# Altium footprint library GBA.PcbLib: 110 footprints (part 4 of 7)
Each footprint in its own frame and in the unit in brackets; x right, y up, seen from the top. Pads: shape width x height; smd on the part's side, far side on the other; paste and mask are expansions set on the pad; w line width, h text height; cw(c..) or ccw(c..) is an arc to the next point about the centre after c.
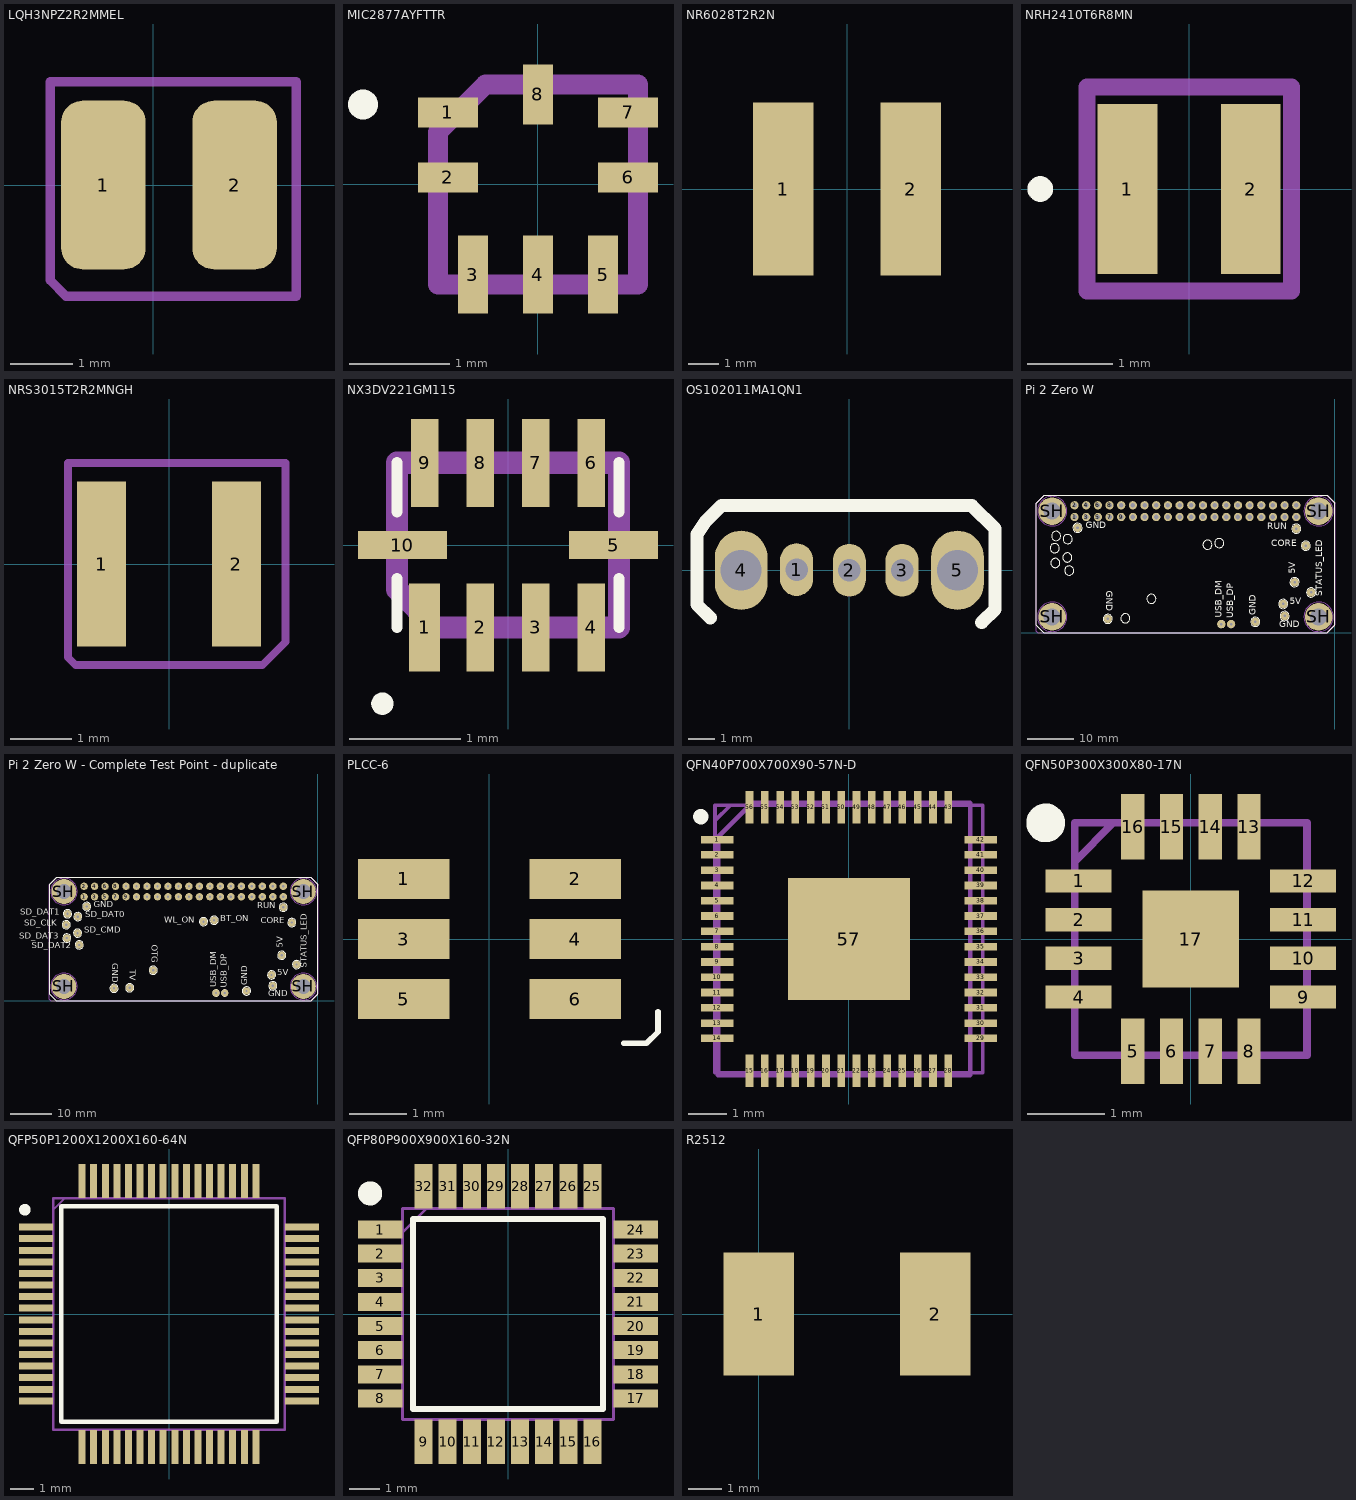
[diagram p3: the footprints below, top view; thin cyan lines are the x and y axes]

## LOGO [mm]

## LQH3NPZ2R2MMEL [mm]
pads (2):
  rrect50% 1.35x2.7 smd: 1(-0.8,0) 2(1.3,0)
Top Designator (Mech29):
  lines w0.15: -1.651,-1.524 -1.651,1.651 2.286,1.651 2.286,-1.778 -1.397,-1.778 -1.651,-1.524
  text ".Designator" at -0.8,-0.381 h0.8
3D body "Murata_LQH3NP_M0.step": height 1.4, standoff -0.01, extent -1.256,-1.5 1.764,1.5

## MIC2877AYFTTR [mm]
pads (8):
  rect 0.6x0.3 smd: 1(-0.9,0.72) 2(-0.9,0.07) 6(0.9,0.07) 7(0.9,0.72)
  rect 0.3x0.78 smd: 3(-0.65,-0.9) 4(0,-0.9) 5(0.65,-0.9)
  rect 0.3x0.6 smd: 8(0,0.9)
Top Overlay:
  lines w0.2: -1.8,0.8 ccw(c-1.75,0.8) -1.7,0.8 ; -1.8,0.8 cw(c-1.75,0.8) -1.7,0.8 ; -1.8,0.8 ccw(c-1.75,0.8) -1.7,0.8
Top Designator:
  lines w0.2: -1,-1 1,-1 1,1 -0.524,1 -1,0.524 -1,-1
  text ".Designator" at -0.889,-0.635 h1
3D body "MIC2877-AYFT-TR.stp": height 0.7, standoff 0, extent -1,-1 1,1

## NR6028T2R2N [mm]
pads (2):
  rect 2x5.7 smd: 1(-2.1,0) 2(2.1,0)
Top Designator (Mech29):
  text ".Designator" at -2.2,-0.8 h1
3D body "User Library-DJNR6028.STEP": height 2.58, standoff 0, extent -3,-3.073 3,3.073

## NRH2410T6R8MN [mm]
pads (2):
  rect 0.7x2 smd: 1(-0.725,0) 2(0.725,0)
Top Overlay:
  lines w0.2: -1.8,0 ccw(c-1.75,0) -1.7,0 ; -1.8,0 cw(c-1.75,0) -1.7,0 ; -1.8,0 ccw(c-1.75,0) -1.7,0
Top Designator:
  lines w0.2: -1.2,-1.2 1.2,-1.2 1.2,1.2 -1.2,1.2 -1.2,-1.2
  text ".Designator" at -1.016,-0.635 h1
3D body "NRH2410T6R8MN.stp": height 1.1, standoff 0, extent -1.2,-1.2 1.2,1.2

## NRS3015T2R2MNGH [mm]
pads (2):
  rect 0.8x2.7 smd: 1(-1.1,0) 2(1.1,0)
Top Designator (Mech29):
  lines w0.127: -1.651,-1.524 -1.651,1.651 1.905,1.651 1.905,-1.27 1.524,-1.651 -1.524,-1.651 -1.651,-1.524
  text ".Designator" at -1.016,-0.508 h1
3D body "User Library-nr3015.step": height 1.45, standoff -0.04, extent -1.524,-1.5 1.476,1.5

## NX3DV221GM115 [mm]
pads (10):
  rect 0.28x0.792 smd: 1(-0.75,-0.741)
  rect 0.25x0.792 smd: 2(-0.25,-0.741) 3(0.25,-0.741) 4(0.75,-0.741) 6(0.75,0.741) 7(0.25,0.741) 8(-0.25,0.741) 9(-0.75,0.741)
  rect 0.8x0.25 smd: 5(0.95,0) 10(-0.95,0)
Top Overlay:
  lines w0.1: -1,-0.741 -1,-0.3 ; -1,0.3 -1,0.741 ; 1,-0.741 1,-0.3 ; 1,0.3 1,0.741 ; -1.181,-1.427 cw(c-1.131,-1.427) -1.081,-1.427 cw(c-1.131,-1.427) -1.181,-1.427
Top Designator:
  lines w0.2: -1,-0.397 -1,0.741 1,0.741 1,-0.741 -0.656,-0.741 -1,-0.397
  text ".Designator" at -0.635,-0.381 h1
3D body "NX3DV221GM,115.stp": height 0.6, standoff 0, extent -1,-0.741 1,0.741

## OS102011MA1QN1 [mm]
pads (5):
  oval 1.25x2 hole 0.85: 1(-2,0.025) 2(0,0) 3(2,0)
  oval 2x3 hole 1.55: 4(-4.1,0) 5(4.1,0)
Top Overlay:
  lines w0.5: -5.275,-1.8 -5.775,-1.3 -5.775,1.362 -5.425,1.875 -4.85,2.45 4.65,2.45 5.525,1.575 5.525,-1.475 5.025,-1.975
Top Designator (Mech29):
  text ".Designator" at -3.875,-1.175 h1
3D body "OS102011MA1QN1.stp": height 4.4, standoff -3.2, extent -4.3,-6.2 4.3,2.2

## Pi 2 Zero W [mm]
pads (55):
  round 1.8 hole 1: 1(-56.63,25.23) 2(-56.63,27.77) 3(-54.09,25.23) 4(-54.09,27.77) 5(-51.55,25.23) 6(-51.55,27.77) 7(-49.01,25.23) 8(-49.01,27.77) 9(-46.47,25.23) 10(-46.47,27.77) 11(-43.93,25.23) 12(-43.93,27.77) 13(-41.39,25.23) 14(-41.39,27.77) 15(-38.85,25.23) 16(-38.85,27.77) 17(-36.31,25.23) 18(-36.31,27.77) 19(-33.77,25.23) 20(-33.77,27.77) 21(-31.23,25.23) 22(-31.23,27.77) 23(-28.69,25.23) 24(-28.69,27.77) 25(-26.15,25.23) 26(-26.15,27.77) 27(-23.61,25.23) 28(-23.61,27.77) 29(-21.07,25.23) 30(-21.07,27.77) 31(-18.53,25.23) 32(-18.53,27.77) 33(-15.99,25.23) 34(-15.99,27.77) 35(-13.45,25.23) 36(-13.45,27.77) 37(-10.91,25.23) 38(-10.91,27.77) 39(-8.37,25.23) 40(-8.37,27.77)
  round 1.8 hole 0.55: 5V_1(-11.21,6.3) 5V_2(-8.75,11.05) CORE(-6.3,18.98) DM(-24.68,1.92) DP(-22.55,1.92) GND_1(-55.99,22.87) GND_2(-49.38,3.05) GND_3(-17.29,2.41) GND_4(-10.9,3.69) RUN(-8.37,22.69) ST_LED(-5.15,8.8)
  round 6 / inner round 0 / far side round 0 hole 3.7 unplated: SH(-61.5,3.5) SH(-61.5,26.5) SH(-3.5,3.5) SH(-3.5,26.5)
Top Overlay:
  circle w0.254: c-56.63,27.77 r0.51
  circle w0.254: c-51.55,27.77 r0.51
  circle w0.254: c-54.09,27.77 r0.51
  circle w0.254: c-46.47,27.77 r0.51
  circle w0.254: c-36.31,27.77 r0.51
  circle w0.254: c-49.01,27.77 r0.51
  circle w0.254: c-43.93,27.77 r0.51
  circle w0.254: c-41.39,27.77 r0.51
  circle w0.254: c-38.85,27.77 r0.51
  circle w0.254: c-33.77,27.77 r0.51
  circle w0.254: c-13.45,27.77 r0.51
  circle w0.254: c-10.91,27.77 r0.51
  circle w0.254: c-21.07,27.77 r0.51
  circle w0.254: c-28.69,27.77 r0.51
  circle w0.254: c-26.15,27.77 r0.51
  circle w0.254: c-23.61,27.77 r0.51
  circle w0.254: c-18.53,27.77 r0.51
  circle w0.254: c-15.99,27.77 r0.51
  circle w0.254: c-31.23,27.77 r0.51
  circle w0.254: c-8.37,27.77 r0.51
  circle w0.254: c-56.63,25.23 r0.51
  circle w0.254: c-51.55,25.23 r0.51
  circle w0.254: c-54.09,25.23 r0.51
  circle w0.254: c-46.47,25.23 r0.51
  circle w0.254: c-36.31,25.23 r0.51
  circle w0.254: c-49.01,25.23 r0.51
  circle w0.254: c-43.93,25.23 r0.51
  circle w0.254: c-41.39,25.23 r0.51
  circle w0.254: c-38.85,25.23 r0.51
  circle w0.254: c-33.77,25.23 r0.51
  circle w0.254: c-13.45,25.23 r0.51
  circle w0.254: c-10.91,25.23 r0.51
  circle w0.254: c-8.37,25.23 r0.51
  circle w0.254: c-21.07,25.23 r0.51
  circle w0.254: c-28.69,25.23 r0.51
  circle w0.254: c-26.15,25.23 r0.51
  circle w0.254: c-23.61,25.23 r0.51
  circle w0.254: c-18.53,25.23 r0.51
  circle w0.254: c-15.99,25.23 r0.51
  circle w0.254: c-31.23,25.23 r0.51
  circle w0.254: c-61.5,3.5 r1.25
  circle w0.254: c-61.5,26.5 r1.25
  circle w0.254: c-39.9,7.42 r1
  circle w0.254: c-8.37,22.69 r1
  circle w0.254: c-22.55,1.92 r0.75
  circle w0.254: c-6.3,18.98 r1
  circle w0.254: c-49.38,3.05 r1
  circle w0.254: c-55.99,22.87 r1
  circle w0.254: c-10.9,3.69 r1
  circle w0.254: c-17.29,2.41 r1
  circle w0.254: c-27.7,19.2 r1
  circle w0.254: c-25.13,19.55 r1
  circle w0.254: c-8.75,11.05 r1
  circle w0.254: c-11.21,6.3 r1
  circle w0.254: c-5.15,8.8 r1
  circle w0.254: c-24.68,1.92 r0.75
  circle w0.254: c-45.58,3.17 r1
  circle w0.254: c-60.95,18.45 r1
  circle w0.254: c-58.2,16.42 r1
  circle w0.254: c-57.78,13.57 r1
  circle w0.254: c-60.65,21.1 r1
  circle w0.254: c-58.13,20.42 r1
  circle w0.254: c-60.8,15.22 r1
  circle w0.254: c-3.5,3.5 r1.25
  circle w0.254: c-3.5,26.5 r1.25
  lines w0.127: -65,1.627 -65,28.218 -63.218,30 -1.679,30 0,28.321 0,27.178 0,1.651 -1.651,0 -63.373,0 -65,1.627
  text "RUN" at -14.732,21.998 h2.5
  text "CORE" at -13.843,18.315 h2.5
  text "GND" at -54.229,22.252 h2.5
  text "GND" at -50.265,9.144 h2.5
  text "GND" at -16.663,3.81 h2.5
  text "GND" at -12.065,0.662 h2.5
  text "5V" at -9.779,5.742 h2.5
  text "5V" at -8.026,12.826 h2.5
  text "STATUS_LED" at -2.223,8.001 h2.5
  text "USB_DP" at -21.527,3.175 h2.5
  text "USB_DM" at -24.067,3.302 h2.5
Top Paste:
  drawing of 27 lines, arcs and shapes, not listed
Top Designator:
  lines w0.127: -65.024,0.381 -64.643,0 -1.778,0 0.127,1.905 0.127,28.067 -1.778,29.972 -63.246,29.972 -65.024,28.194 -65.024,0.381
  text ".Designator" at -42.545,13.843 h1.5
Mechanical 11:
  circle w0.1: c-61.5,3.5 r2.55
  circle w0.1: c-61.5,26.5 r2.55
  circle w0.1: c-3.5,26.5 r2.55
  circle w0.1: c-3.5,3.5 r2.55
Mechanical 13:
  circle w0.1: c-61.5,3.5 r2.55
  circle w0.1: c-61.5,26.5 r2.55
  circle w0.1: c-3.5,26.5 r2.55
  circle w0.1: c-3.5,3.5 r2.55
Mechanical 15:
  circle w0.05: c-61.5,3.5 r3.2
  circle w0.05: c-61.5,26.5 r3.2
  circle w0.05: c-3.5,26.5 r3.2
  circle w0.05: c-3.5,3.5 r3.2
  lines w0.05: -62,3.5 -61,3.5 ; -62,26.5 -61,26.5 ; -61.5,3 -61.5,4 ; -61.5,26 -61.5,27 ; -4,3.5 -3,3.5 ; -4,26.5 -3,26.5 ; -3.5,3 -3.5,4 ; -3.5,26 -3.5,27
3D body "9774025151.stp": height 2.5, standoff -1.4, extent -64.05,0.953 -58.95,6.047
3D body "9774025151.stp": height 2.5, standoff -1.4, extent -64.05,23.953 -58.95,29.047
3D body "9774025151.stp": height 2.5, standoff -1.4, extent -6.05,23.953 -0.95,29.047
3D body "9774025151.stp": height 2.5, standoff -1.4, extent -6.05,0.953 -0.95,6.047
3D body "Raspberry Pi Zero 2 W.STEP": height 8.25, standoff 3.2, extent -65,-0.576 0.8,30
3D body "mill-max-0906-0-15-20-76-14-11-0.step": height 3.53, standoff -1.7, extent -25.594,1.006 -23.766,2.834
3D body "mill-max-0906-0-15-20-76-14-11-0.step": height 3.53, standoff -1.7, extent -23.464,1.006 -21.636,2.834
3D body "mill-max-0906-0-15-20-76-14-11-0.step": height 3.53, standoff -1.7, extent -50.294,2.136 -48.466,3.964
3D body "mill-max-0906-0-15-20-76-14-11-0.step": height 3.53, standoff -1.7, extent -56.904,21.956 -55.076,23.784
3D body "mill-max-0906-0-15-20-76-14-11-0.step": height 3.53, standoff -1.7, extent -18.204,1.496 -16.376,3.324
3D body "mill-max-0906-0-15-20-76-14-11-0.step": height 3.53, standoff -1.7, extent -11.814,2.776 -9.986,4.604
3D body "mill-max-0906-0-15-20-76-14-11-0.step": height 3.53, standoff -1.7, extent -12.124,5.386 -10.296,7.214
3D body "mill-max-0906-0-15-20-76-14-11-0.step": height 3.53, standoff -1.7, extent -6.064,7.886 -4.236,9.714
3D body "mill-max-0906-0-15-20-76-14-11-0.step": height 3.53, standoff -1.7, extent -9.664,10.136 -7.836,11.964
3D body "mill-max-0906-0-15-20-76-14-11-0.step": height 3.53, standoff -1.7, extent -7.214,18.066 -5.386,19.894
3D body "mill-max-0906-0-15-20-76-14-11-0.step": height 3.53, standoff -1.7, extent -9.284,21.776 -7.456,23.604
3D body "s10129381-X40002XLF.stp": height 8.18, standoff -2.49, extent -57.912,24.103 -7.112,28.933

## Pi 2 Zero W - Complete Test Point - duplicate [mm]
pads (65):
  round 1.8 hole 0.55: 1(-56.63,25.23) 2(-56.63,27.77) 3(-54.09,25.23) 4(-54.09,27.77) 5(-51.55,25.23) 5V_1(-11.21,6.3) 5V_2(-8.75,11.05) 6(-51.55,27.77) 7(-49.01,25.23) 8(-49.01,27.77) 9(-46.47,25.23) 10(-46.47,27.77) 11(-43.93,25.23) 12(-43.93,27.77) 13(-41.39,25.23) 14(-41.39,27.77) 15(-38.85,25.23) 16(-38.85,27.77) 17(-36.31,25.23) 18(-36.31,27.77) 19(-33.77,25.23) 20(-33.77,27.77) 21(-31.23,25.23) 22(-31.23,27.77) 23(-28.69,25.23) 24(-28.69,27.77) 25(-26.15,25.23) 26(-26.15,27.77) 27(-23.61,25.23) 28(-23.61,27.77) 29(-21.07,25.23) 30(-21.07,27.77) 31(-18.53,25.23) 32(-18.53,27.77) 33(-15.99,25.23) 34(-15.99,27.77) 35(-13.45,25.23) 36(-13.45,27.77) 37(-10.91,25.23) 38(-10.91,27.77) 39(-8.37,25.23) 40(-8.37,27.77) BT_ON(-25.13,19.55) CLK(-60.95,18.45) CMD(-58.2,16.42) CORE(-6.3,18.98) DAT0(-58.13,20.42) DAT1(-60.65,21.1) DAT2(-57.78,13.57) DAT3(-60.8,15.22) DM(-24.68,1.92) DP(-22.55,1.92) GND_1(-55.99,22.87) GND_2(-49.38,3.05) GND_3(-17.29,2.41) GND_4(-10.9,3.69) OTG(-39.9,7.42) RUN(-8.37,22.69) ST_LED(-5.15,8.8) TV(-45.58,3.17) WL_ON(-27.7,19.2)
  round 6 / inner round 0 / far side round 0 hole 3.7 unplated: SH(-61.5,3.5) SH(-61.5,26.5) SH(-3.5,3.5) SH(-3.5,26.5)
Top Overlay:
  circle w0.254: c-56.63,27.77 r0.51
  circle w0.254: c-51.55,27.77 r0.51
  circle w0.254: c-54.09,27.77 r0.51
  circle w0.254: c-46.47,27.77 r0.51
  circle w0.254: c-36.31,27.77 r0.51
  circle w0.254: c-49.01,27.77 r0.51
  circle w0.254: c-43.93,27.77 r0.51
  circle w0.254: c-41.39,27.77 r0.51
  circle w0.254: c-38.85,27.77 r0.51
  circle w0.254: c-33.77,27.77 r0.51
  circle w0.254: c-13.45,27.77 r0.51
  circle w0.254: c-10.91,27.77 r0.51
  circle w0.254: c-21.07,27.77 r0.51
  circle w0.254: c-28.69,27.77 r0.51
  circle w0.254: c-26.15,27.77 r0.51
  circle w0.254: c-23.61,27.77 r0.51
  circle w0.254: c-18.53,27.77 r0.51
  circle w0.254: c-15.99,27.77 r0.51
  circle w0.254: c-31.23,27.77 r0.51
  circle w0.254: c-8.37,27.77 r0.51
  circle w0.254: c-56.63,25.23 r0.51
  circle w0.254: c-51.55,25.23 r0.51
  circle w0.254: c-54.09,25.23 r0.51
  circle w0.254: c-46.47,25.23 r0.51
  circle w0.254: c-36.31,25.23 r0.51
  circle w0.254: c-49.01,25.23 r0.51
  circle w0.254: c-43.93,25.23 r0.51
  circle w0.254: c-41.39,25.23 r0.51
  circle w0.254: c-38.85,25.23 r0.51
  circle w0.254: c-33.77,25.23 r0.51
  circle w0.254: c-13.45,25.23 r0.51
  circle w0.254: c-10.91,25.23 r0.51
  circle w0.254: c-8.37,25.23 r0.51
  circle w0.254: c-21.07,25.23 r0.51
  circle w0.254: c-28.69,25.23 r0.51
  circle w0.254: c-26.15,25.23 r0.51
  circle w0.254: c-23.61,25.23 r0.51
  circle w0.254: c-18.53,25.23 r0.51
  circle w0.254: c-15.99,25.23 r0.51
  circle w0.254: c-31.23,25.23 r0.51
  circle w0.254: c-61.5,3.5 r1.25
  circle w0.254: c-61.5,26.5 r1.25
  circle w0.254: c-39.9,7.42 r1
  circle w0.254: c-8.37,22.69 r1
  circle w0.254: c-22.55,1.92 r0.75
  circle w0.254: c-6.3,18.98 r1
  circle w0.254: c-49.38,3.05 r1
  circle w0.254: c-55.99,22.87 r1
  circle w0.254: c-10.9,3.69 r1
  circle w0.254: c-17.29,2.41 r1
  circle w0.254: c-27.7,19.2 r1
  circle w0.254: c-25.13,19.55 r1
  circle w0.254: c-8.75,11.05 r1
  circle w0.254: c-11.21,6.3 r1
  circle w0.254: c-5.15,8.8 r1
  circle w0.254: c-24.68,1.92 r0.75
  circle w0.254: c-45.58,3.17 r1
  circle w0.254: c-60.95,18.45 r1
  circle w0.254: c-58.2,16.42 r1
  circle w0.254: c-57.78,13.57 r1
  circle w0.254: c-60.65,21.1 r1
  circle w0.254: c-58.13,20.42 r1
  circle w0.254: c-60.8,15.22 r1
  circle w0.254: c-3.5,3.5 r1.25
  circle w0.254: c-3.5,26.5 r1.25
  lines w0.127: -65,1.627 -65,28.218 -63.218,30 -1.679,30 0,28.321 0,27.178 0,1.651 -1.651,0 -63.373,0 -65,1.627
  text "SD_DAT3" at -72.39,14.542 h2.5
  text "SD_DAT2" at -69.342,12.256 h2.5
  text "SD_DAT1" at -72.136,20.384 h2.5
  text "OTG" at -40.739,13.59 h2.5
  text "RUN" at -14.732,21.998 h2.5
  text "CORE" at -13.843,18.315 h2.5
  text "WL_ON" at -37.211,18.479 h2.5
  text "GND" at -54.229,22.252 h2.5
  text "GND" at -50.265,9.144 h2.5
  text "GND" at -16.663,3.81 h2.5
  text "BT_ON" at -23.622,18.86 h2.5
  text "GND" at -12.065,0.662 h2.5
  text "5V" at -9.779,5.742 h2.5
  text "5V" at -8.026,12.826 h2.5
  text "STATUS_LED" at -2.223,8.001 h2.5
  text "USB_DP" at -21.527,3.175 h2.5
  text "USB_DM" at -24.067,3.302 h2.5
  text "TV" at -46.101,7.493 h2.5
  text "SD_CLK" at -71.12,17.717 h2.5
  text "SD_CMD" at -56.642,16.066 h2.5
  text "SD_DAT0" at -56.388,19.749 h2.5
Top Paste:
  drawing of 77 lines, arcs and shapes, not listed
Top Designator:
  lines w0.127: -65.024,0.381 -64.643,0 -1.778,0 0.127,1.905 0.127,28.067 -1.778,29.972 -63.246,29.972 -65.024,28.194 -65.024,0.381
  text ".Designator" at -42.545,13.843 h1.5
Mechanical 11:
  circle w0.1: c-61.5,3.5 r2.55
  circle w0.1: c-61.5,26.5 r2.55
  circle w0.1: c-3.5,26.5 r2.55
  circle w0.1: c-3.5,3.5 r2.55
Mechanical 13:
  circle w0.1: c-61.5,3.5 r2.55
  circle w0.1: c-61.5,26.5 r2.55
  circle w0.1: c-3.5,26.5 r2.55
  circle w0.1: c-3.5,3.5 r2.55
Mechanical 15:
  circle w0.05: c-61.5,3.5 r3.2
  circle w0.05: c-61.5,26.5 r3.2
  circle w0.05: c-3.5,26.5 r3.2
  circle w0.05: c-3.5,3.5 r3.2
  lines w0.05: -62,3.5 -61,3.5 ; -62,26.5 -61,26.5 ; -61.5,3 -61.5,4 ; -61.5,26 -61.5,27 ; -4,3.5 -3,3.5 ; -4,26.5 -3,26.5 ; -3.5,3 -3.5,4 ; -3.5,26 -3.5,27
3D body "mill-max-0906-0-15-20-76-14-11-0.step": height 3.53, standoff -1.7, extent -40.814,6.506 -38.986,8.334
3D body "mill-max-0906-0-15-20-76-14-11-0.step": height 3.53, standoff -1.7, extent -28.614,18.286 -26.786,20.114
3D body "mill-max-0906-0-15-20-76-14-11-0.step": height 3.53, standoff -1.7, extent -26.044,18.636 -24.216,20.464
3D body "mill-max-0906-0-15-20-76-14-11-0.step": height 3.53, standoff -1.7, extent -9.284,21.776 -7.456,23.604
3D body "mill-max-0906-0-15-20-76-14-11-0.step": height 3.53, standoff -1.7, extent -7.214,18.066 -5.386,19.894
3D body "mill-max-0906-0-15-20-76-14-11-0.step": height 3.53, standoff -1.7, extent -9.664,10.136 -7.836,11.964
3D body "mill-max-0906-0-15-20-76-14-11-0.step": height 3.53, standoff -1.7, extent -6.064,7.886 -4.236,9.714
3D body "mill-max-0906-0-15-20-76-14-11-0.step": height 3.53, standoff -1.7, extent -12.124,5.386 -10.296,7.214
3D body "mill-max-0906-0-15-20-76-14-11-0.step": height 3.53, standoff -1.7, extent -18.204,1.496 -16.376,3.324
3D body "mill-max-0906-0-15-20-76-14-11-0.step": height 3.53, standoff -1.7, extent -23.464,1.006 -21.636,2.834
3D body "mill-max-0906-0-15-20-76-14-11-0.step": height 3.53, standoff -1.7, extent -25.594,1.006 -23.766,2.834
3D body "mill-max-0906-0-15-20-76-14-11-0.step": height 3.53, standoff -1.7, extent -46.494,2.256 -44.666,4.084
3D body "mill-max-0906-0-15-20-76-14-11-0.step": height 3.53, standoff -1.7, extent -50.294,2.136 -48.466,3.964
3D body "mill-max-0906-0-15-20-76-14-11-0.step": height 3.53, standoff -1.7, extent -58.694,12.656 -56.866,14.484
3D body "mill-max-0906-0-15-20-76-14-11-0.step": height 3.53, standoff -1.7, extent -61.714,14.306 -59.886,16.134
3D body "mill-max-0906-0-15-20-76-14-11-0.step": height 3.53, standoff -1.7, extent -59.114,15.506 -57.286,17.334
3D body "mill-max-0906-0-15-20-76-14-11-0.step": height 3.53, standoff -1.7, extent -61.864,17.536 -60.036,19.364
3D body "mill-max-0906-0-15-20-76-14-11-0.step": height 3.53, standoff -1.7, extent -61.564,20.186 -59.736,22.014
3D body "mill-max-0906-0-15-20-76-14-11-0.step": height 3.53, standoff -1.7, extent -59.044,19.506 -57.216,21.334
3D body "mill-max-0906-0-15-20-76-14-11-0.step": height 3.53, standoff -1.7, extent -56.904,21.956 -55.076,23.784
3D body "mill-max-0906-0-15-20-76-14-11-0.step": height 3.53, standoff -1.7, extent -11.814,2.776 -9.986,4.604
3D body "mill-max-0906-0-15-20-76-14-11-0.step": height 3.53, standoff -1.7, extent -11.824,26.856 -9.996,28.684
3D body "mill-max-0906-0-15-20-76-14-11-0.step": height 3.53, standoff -1.7, extent -9.284,24.316 -7.456,26.144
3D body "mill-max-0906-0-15-20-76-14-11-0.step": height 3.53, standoff -1.7, extent -9.284,26.856 -7.456,28.684
3D body "mill-max-0906-0-15-20-76-14-11-0.step": height 3.53, standoff -1.7, extent -11.824,24.316 -9.996,26.144
3D body "mill-max-0906-0-15-20-76-14-11-0.step": height 3.53, standoff -1.7, extent -14.364,26.856 -12.536,28.684
3D body "mill-max-0906-0-15-20-76-14-11-0.step": height 3.53, standoff -1.7, extent -16.904,26.856 -15.076,28.684
3D body "mill-max-0906-0-15-20-76-14-11-0.step": height 3.53, standoff -1.7, extent -14.364,24.316 -12.536,26.144
3D body "mill-max-0906-0-15-20-76-14-11-0.step": height 3.53, standoff -1.7, extent -16.904,24.316 -15.076,26.144
3D body "mill-max-0906-0-15-20-76-14-11-0.step": height 3.53, standoff -1.7, extent -19.444,24.316 -17.616,26.144
3D body "mill-max-0906-0-15-20-76-14-11-0.step": height 3.53, standoff -1.7, extent -19.444,26.856 -17.616,28.684
3D body "mill-max-0906-0-15-20-76-14-11-0.step": height 3.53, standoff -1.7, extent -24.524,26.856 -22.696,28.684
3D body "mill-max-0906-0-15-20-76-14-11-0.step": height 3.53, standoff -1.7, extent -21.984,26.856 -20.156,28.684
3D body "mill-max-0906-0-15-20-76-14-11-0.step": height 3.53, standoff -1.7, extent -21.984,24.316 -20.156,26.144
3D body "mill-max-0906-0-15-20-76-14-11-0.step": height 3.53, standoff -1.7, extent -24.524,24.316 -22.696,26.144
3D body "mill-max-0906-0-15-20-76-14-11-0.step": height 3.53, standoff -1.7, extent -27.064,26.856 -25.236,28.684
3D body "mill-max-0906-0-15-20-76-14-11-0.step": height 3.53, standoff -1.7, extent -27.064,24.316 -25.236,26.144
3D body "mill-max-0906-0-15-20-76-14-11-0.step": height 3.53, standoff -1.7, extent -29.604,26.856 -27.776,28.684
3D body "mill-max-0906-0-15-20-76-14-11-0.step": height 3.53, standoff -1.7, extent -29.604,24.316 -27.776,26.144
3D body "mill-max-0906-0-15-20-76-14-11-0.step": height 3.53, standoff -1.7, extent -32.144,24.316 -30.316,26.144
3D body "mill-max-0906-0-15-20-76-14-11-0.step": height 3.53, standoff -1.7, extent -32.144,26.856 -30.316,28.684
3D body "mill-max-0906-0-15-20-76-14-11-0.step": height 3.53, standoff -1.7, extent -34.684,26.856 -32.856,28.684
3D body "mill-max-0906-0-15-20-76-14-11-0.step": height 3.53, standoff -1.7, extent -34.684,24.316 -32.856,26.144
3D body "mill-max-0906-0-15-20-76-14-11-0.step": height 3.53, standoff -1.7, extent -42.304,26.856 -40.476,28.684
3D body "mill-max-0906-0-15-20-76-14-11-0.step": height 3.53, standoff -1.7, extent -39.764,26.856 -37.936,28.684
3D body "mill-max-0906-0-15-20-76-14-11-0.step": height 3.53, standoff -1.7, extent -37.224,26.856 -35.396,28.684
3D body "mill-max-0906-0-15-20-76-14-11-0.step": height 3.53, standoff -1.7, extent -37.224,24.316 -35.396,26.144
3D body "mill-max-0906-0-15-20-76-14-11-0.step": height 3.53, standoff -1.7, extent -39.764,24.316 -37.936,26.144
3D body "mill-max-0906-0-15-20-76-14-11-0.step": height 3.53, standoff -1.7, extent -42.304,24.316 -40.476,26.144
3D body "mill-max-0906-0-15-20-76-14-11-0.step": height 3.53, standoff -1.7, extent -44.844,26.856 -43.016,28.684
3D body "mill-max-0906-0-15-20-76-14-11-0.step": height 3.53, standoff -1.7, extent -44.844,24.316 -43.016,26.144
3D body "mill-max-0906-0-15-20-76-14-11-0.step": height 3.53, standoff -1.7, extent -47.384,26.856 -45.556,28.684
3D body "mill-max-0906-0-15-20-76-14-11-0.step": height 3.53, standoff -1.7, extent -47.384,24.316 -45.556,26.144
3D body "mill-max-0906-0-15-20-76-14-11-0.step": height 3.53, standoff -1.7, extent -49.924,26.856 -48.096,28.684
3D body "mill-max-0906-0-15-20-76-14-11-0.step": height 3.53, standoff -1.7, extent -49.924,24.316 -48.096,26.144
3D body "mill-max-0906-0-15-20-76-14-11-0.step": height 3.53, standoff -1.7, extent -52.464,24.316 -50.636,26.144
3D body "mill-max-0906-0-15-20-76-14-11-0.step": height 3.53, standoff -1.7, extent -52.464,26.856 -50.636,28.684
3D body "mill-max-0906-0-15-20-76-14-11-0.step": height 3.53, standoff -1.7, extent -55.004,26.856 -53.176,28.684
3D body "mill-max-0906-0-15-20-76-14-11-0.step": height 3.53, standoff -1.7, extent -57.544,26.856 -55.716,28.684
3D body "mill-max-0906-0-15-20-76-14-11-0.step": height 3.53, standoff -1.7, extent -55.004,24.316 -53.176,26.144
3D body "mill-max-0906-0-15-20-76-14-11-0.step": height 3.53, standoff -1.7, extent -57.544,24.316 -55.716,26.144
3D body "9774025151.stp": height 2.5, standoff -1.4, extent -64.05,0.953 -58.95,6.047
3D body "9774025151.stp": height 2.5, standoff -1.4, extent -64.05,23.953 -58.95,29.047
3D body "9774025151.stp": height 2.5, standoff -1.4, extent -6.05,23.953 -0.95,29.047
3D body "9774025151.stp": height 2.5, standoff -1.4, extent -6.05,0.953 -0.95,6.047
3D body "Raspberry Pi Zero 2 W.STEP": height 8.25, standoff 3.2, extent -65,-0.576 0.8,30

## PLCC-6 [mm] "PLCC-6"
pads (6):
  rect 1.6x0.7 smd: 1(-1.5,1.05) 2(1.5,1.05) 3(-1.5,0) 4(1.5,0) 5(-1.5,-1.05) 6(1.5,-1.05)
Top Overlay:
  lines w0.1: 2.35,-1.825 2.75,-1.825 2.95,-1.625 2.95,-1.275
3D body "User Library-LED_RGB_Osram_LRTB_G6SG.step": height 2.01, standoff 0, extent -1.825,-1.725 1.775,1.775

## QFN40P700X700X90-57N-D [mm]
pads (57):
  rect 0.85x0.2 smd: 1(-3.45,2.6) 2(-3.45,2.2) 3(-3.45,1.8) 4(-3.45,1.4) 5(-3.45,1) 6(-3.45,0.6) 7(-3.45,0.2) 8(-3.45,-0.2) 9(-3.45,-0.6) 10(-3.45,-1) 11(-3.45,-1.4) 12(-3.45,-1.8) 13(-3.45,-2.2) 14(-3.45,-2.6) 29(3.45,-2.6) 30(3.45,-2.2) 31(3.45,-1.8) 32(3.45,-1.4) 33(3.45,-1) 34(3.45,-0.6) 35(3.45,-0.2) 36(3.45,0.2) 37(3.45,0.6) 38(3.45,1) 39(3.45,1.4) 40(3.45,1.8) 41(3.45,2.2) 42(3.45,2.6)
  rect 0.2x0.85 smd: 15(-2.6,-3.45) 16(-2.2,-3.45) 17(-1.8,-3.45) 18(-1.4,-3.45) 19(-1,-3.45) 20(-0.6,-3.45) 21(-0.2,-3.45) 22(0.2,-3.45) 23(0.6,-3.45) 24(1,-3.45) 25(1.4,-3.45) 26(1.8,-3.45) 27(2.2,-3.45) 28(2.6,-3.45) 43(2.6,3.45) 44(2.2,3.45) 45(1.8,3.45) 46(1.4,3.45) 47(1,3.45) 48(0.6,3.45) 49(0.2,3.45) 50(-0.2,3.45) 51(-0.6,3.45) 52(-1,3.45) 53(-1.4,3.45) 54(-1.8,3.45) 55(-2.2,3.45) 56(-2.6,3.45)
  rect 3.2x3.2 smd: 57(0,0)
Top Overlay:
  circle w0.2: c-3.875,3.2 r0.1
Top Designator:
  lines w0.127: -3.429,-3.556 3.175,-3.556 3.175,3.556 -2.54,3.556 -3.429,2.667 -3.429,-3.556
  text ".Designator" at -1.905,-0.319 h1
Mechanical 13:
  lines w0.1: -3.5,3.1 -3.1,3.5 ; -3.5,-3.5 3.5,-3.5 3.5,3.5 -3.5,3.5 -3.5,-3.5
3D body "RP2040.stp": height 0.9, standoff 0, extent -3.55,-3.55 3.55,3.55

## QFN50P300X300X80-17N [mm]
pads (17):
  rect 0.85x0.3 smd: 1(-1.45,0.75) 2(-1.45,0.25) 3(-1.45,-0.25) 4(-1.45,-0.75) 9(1.45,-0.75) 10(1.45,-0.25) 11(1.45,0.25) 12(1.45,0.75)
  rect 0.3x0.85 smd: 5(-0.75,-1.45) 6(-0.25,-1.45) 7(0.25,-1.45) 8(0.75,-1.45) 13(0.75,1.45) 14(0.25,1.45) 15(-0.25,1.45) 16(-0.75,1.45)
  rect 1.25x1.25 smd: 17(0,0)
Top Overlay:
  circle w0.25: c-1.875,1.5 r0.125
Top Designator (Mech29):
  lines w0.1: -1.5,1 -1,1.5 ; -1.5,-1.5 -1.5,1.5 1.5,1.5 1.5,-1.5 -1.5,-1.5
  text ".Designator" at -1.905,-0.635 h1
3D body "MAX98307ETE+T.stp": height 0.8, standoff 0, extent -1.55,-1.55 1.55,1.55

## QFP50P1200X1200X160-64N [mm]
pads (64):
  rect 1.475x0.3 smd: 1(-5.738,3.75) 2(-5.738,3.25) 3(-5.738,2.75) 4(-5.738,2.25) 5(-5.738,1.75) 6(-5.738,1.25) 7(-5.738,0.75) 8(-5.738,0.25) 9(-5.738,-0.25) 10(-5.738,-0.75) 11(-5.738,-1.25) 12(-5.738,-1.75) 13(-5.738,-2.25) 14(-5.738,-2.75) 15(-5.738,-3.25) 16(-5.738,-3.75) 33(5.738,-3.75) 34(5.738,-3.25) 35(5.738,-2.75) 36(5.738,-2.25) 37(5.738,-1.75) 38(5.738,-1.25) 39(5.738,-0.75) 40(5.738,-0.25) 41(5.738,0.25) 42(5.738,0.75) 43(5.738,1.25) 44(5.738,1.75) 45(5.738,2.25) 46(5.738,2.75) 47(5.738,3.25) 48(5.738,3.75)
  rect 0.3x1.475 smd: 17(-3.75,-5.738) 18(-3.25,-5.738) 19(-2.75,-5.738) 20(-2.25,-5.738) 21(-1.75,-5.738) 22(-1.25,-5.738) 23(-0.75,-5.738) 24(-0.25,-5.738) 25(0.25,-5.738) 26(0.75,-5.738) 27(1.25,-5.738) 28(1.75,-5.738) 29(2.25,-5.738) 30(2.75,-5.738) 31(3.25,-5.738) 32(3.75,-5.738) 49(3.75,5.738) 50(3.25,5.738) 51(2.75,5.738) 52(2.25,5.738) 53(1.75,5.738) 54(1.25,5.738) 55(0.75,5.738) 56(0.25,5.738) 57(-0.25,5.738) 58(-0.75,5.738) 59(-1.25,5.738) 60(-1.75,5.738) 61(-2.25,5.738) 62(-2.75,5.738) 63(-3.25,5.738) 64(-3.75,5.738)
Top Overlay:
  circle w0.25: c-6.225,4.5 r0.125
  lines w0.2: -4.65,-4.65 4.65,-4.65 4.65,4.65 -4.65,4.65 -4.65,-4.65
Top Designator (Mech29):
  lines w0.1: -5,4.5 -4.5,5 ; -5,-5 -5,5 5,5 5,-5 -5,-5
  text ".Designator" at -1.905,-0.254 h1
3D body "STM32F205RET6.stp": height 1.6, standoff 0, extent -6,-6 6,6

## QFP80P900X900X160-32N [mm]
pads (32):
  rect 1.475x0.6 smd: 1(-4.238,2.8) 2(-4.238,2) 3(-4.238,1.2) 4(-4.238,0.4) 5(-4.238,-0.4) 6(-4.238,-1.2) 7(-4.238,-2) 8(-4.238,-2.8) 17(4.238,-2.8) 18(4.238,-2) 19(4.238,-1.2) 20(4.238,-0.4) 21(4.238,0.4) 22(4.238,1.2) 23(4.238,2) 24(4.238,2.8)
  rect 0.6x1.475 smd: 9(-2.8,-4.238) 10(-2,-4.238) 11(-1.2,-4.238) 12(-0.4,-4.238) 13(0.4,-4.238) 14(1.2,-4.238) 15(2,-4.238) 16(2.8,-4.238) 25(2.8,4.238) 26(2,4.238) 27(1.2,4.238) 28(0.4,4.238) 29(-0.4,4.238) 30(-1.2,4.238) 31(-2,4.238) 32(-2.8,4.238)
Top Overlay:
  circle w0.4: c-4.575,4 r0.2
  lines w0.2: -3.15,-3.15 -3.15,3.15 3.15,3.15 3.15,-3.15 -3.15,-3.15
Top Designator:
  lines w0.1: -3.5,2.7 -2.7,3.5 ; -3.5,-3.5 -3.5,3.5 3.5,3.5 3.5,-3.5 -3.5,-3.5
  text ".Designator" at -2.032,-0.192 h1
3D body "TUSB2036VFRG4.stp": height 1.5, standoff 0, extent -4.515,-4.515 4.515,4.515

## R2512 [mm]
pads (2):
  rect 2.11x3.68 smd: 1(0,0) 2(5.29,0)
3D body "User Library-R SMD 2512.STEP": height 0.59, standoff -0.01, extent -0.556,-1.575 5.744,1.575